# Altium integrated library CoLib.IntLib: 649 symbols (part 4 of 5) (continued)
## LFEC3E-5T144C (continued)
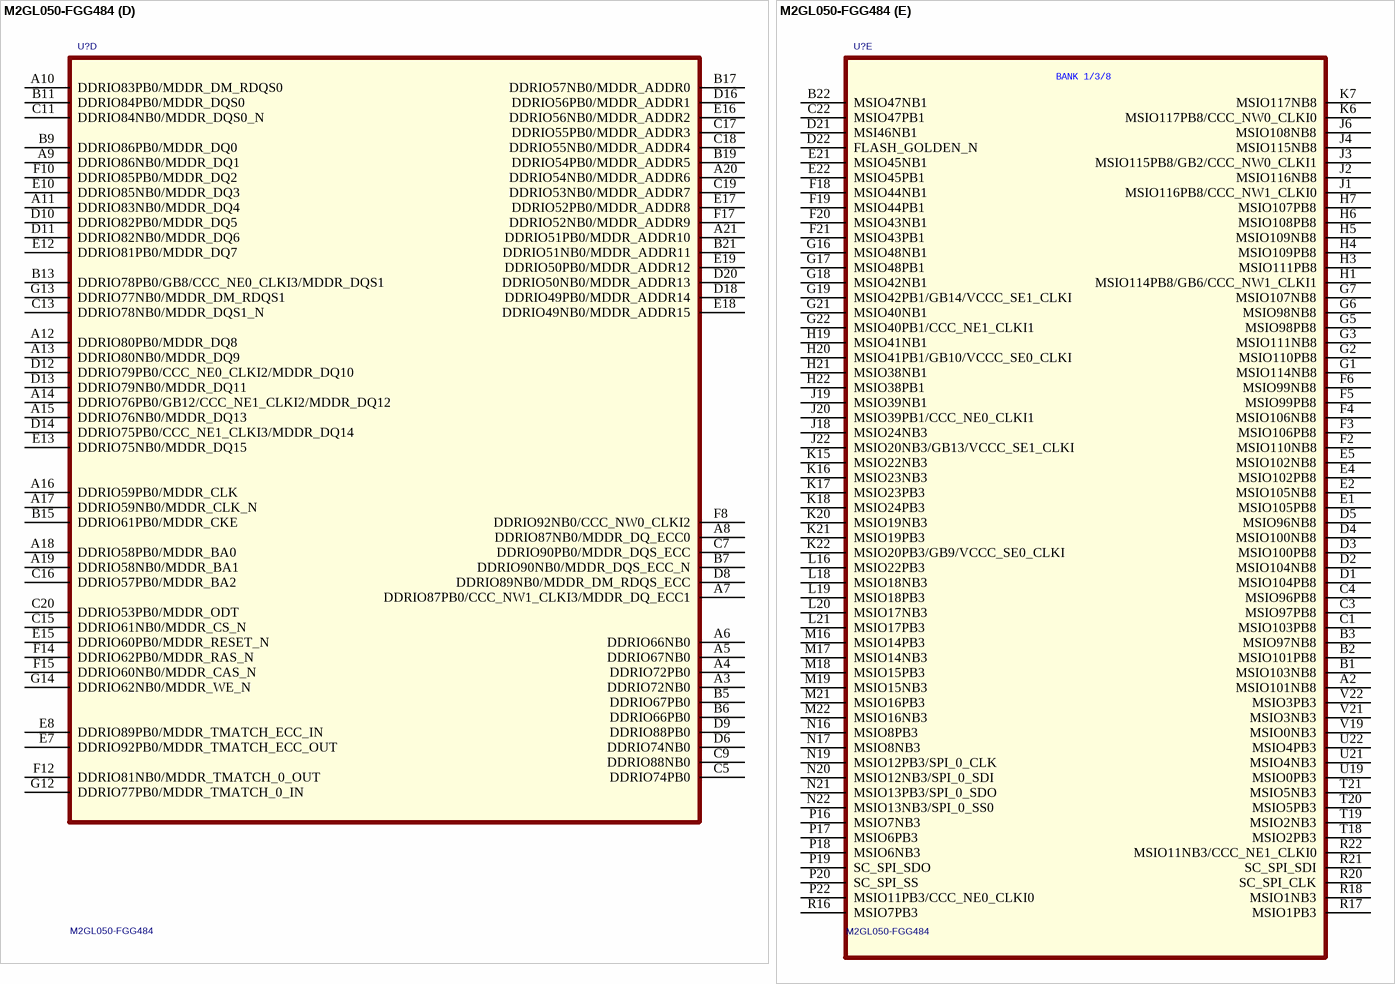
[diagram p32: symbol M2GL050-FGG484]
part A text: BANK 0
part B text: BANK 1
part C text: BANK 2
part D text: BANK 3
part E text: BANK 4
part F text: BANK 5
part G text: BANK 6
part H text: BANK 7

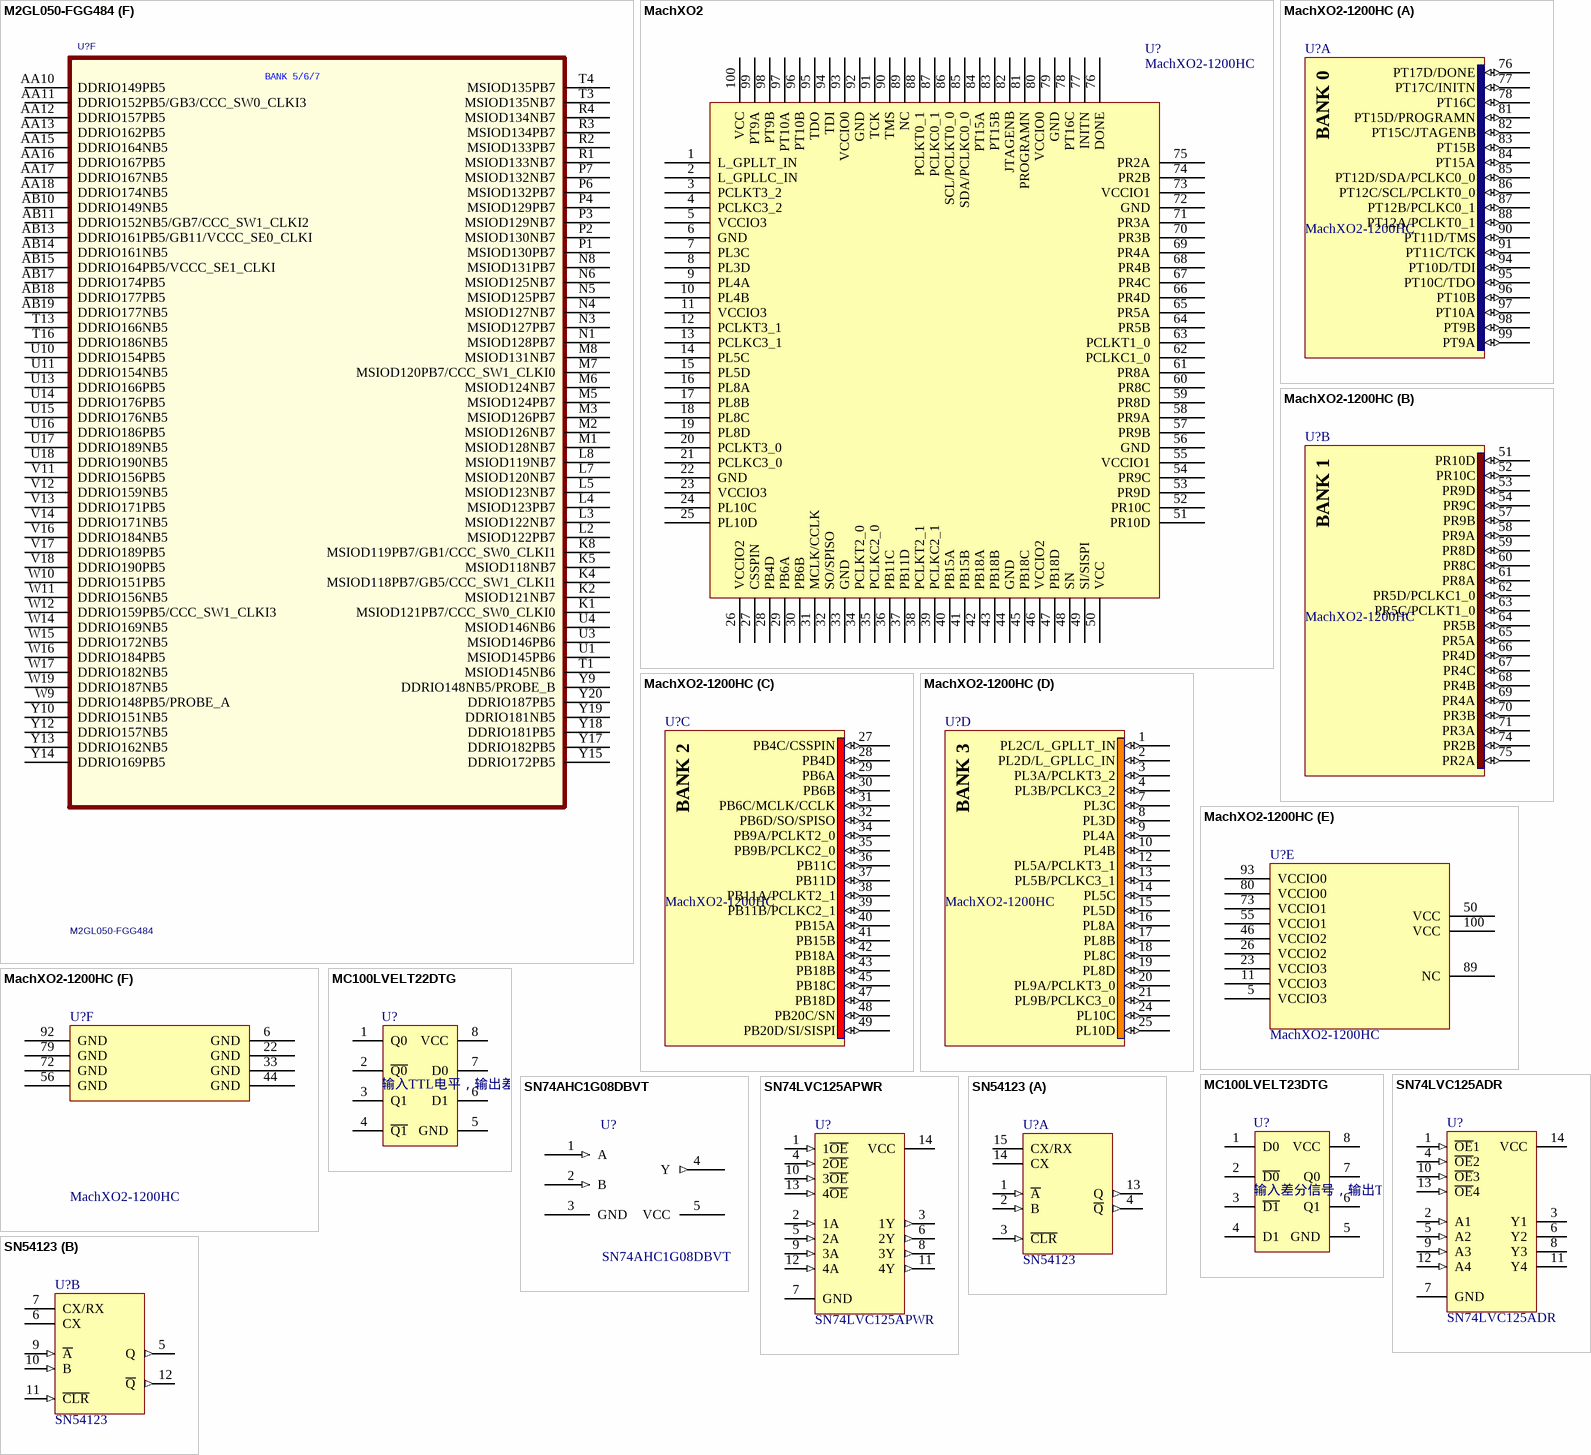
[diagram p33: symbols M2GL050-FGG484 to SN54123]

## M2GL050-FGG484
designator U?
FPGA; Manufacturer: ACTEL; Name: FPGA; Ordering NO.: M2GL050-FGG484
footprint BGA484/1.0_22*22 (BGA, 484-Leads, Body 23.0x23.0mm,  Pitch 1.00mm)
part A pins: AA19 VDDI5_1 (hiz), AB12 VDDI5_2 (hiz), B8 VDDI0_1 (hiz), B12 VDDI0_6 (hiz), B16 VDDI0_7 (hiz), B20 VDDI0_8 (hiz), C2 VDDI8_1 (hiz), C6 VDDI0_9 (hiz), C10 VDDI0_2 (hiz), C14 VDDI0_3 (hiz), D17 VDDI0_10 (hiz), E11 VDDI0_11 (hiz), E20 VDDI1_2 (hiz), F1 VDDI8_2 (hiz), F7 VDDI0_4 (hiz), F9 VDDI0_5 (hiz), F13 VDDI0_12 (hiz), F22 VDDI1_1 (hiz), G4 VDDI8_3 (hiz), G10 VREF0_1 (hiz), G11 VREF0_2 (hiz), G15 VREF0_3 (hiz), H10 VDD1 (hiz), H12 VDDI0_13 (hiz), H14 VDDI0_14 (hiz), H18 VDDI1_3 (hiz), J7 VDDI8_4 (hiz), J9 VDD4 (hiz), J11 VDD2 (hiz), J13 VDD3 (hiz), J21 VDDI1_4 (hiz), K3 VDDI7_1 (hiz), K10 VDD5 (hiz), K12 VDD6 (hiz), K14 VDD7 (hiz), L6 VDDI7_2 (hiz), L9 VDD10 (hiz), L11 VDD8 (hiz), L13 VDD9 (hiz), L15 VPP1 (hiz), L17 VDDI3_1 (hiz), M10 VDD11 (hiz), M12 VDD12 (hiz), M14 VDD13 (hiz), M15 VPPNVM (hiz), M20 VDDI3_2 (hiz), N2 VDDI7_3 (hiz), N9 VDD16 (hiz), N11 VDD14 (hiz), N13 VDD15 (hiz), P5 VDDI7_4 (hiz), P8 VDD20 (hiz), P10 VDD17 (hiz), P12 VDD18 (hiz), P14 VDD19 (hiz), P15 VPP2 (hiz), R8 VDD23 (hiz), R11 VDD21 (hiz), R13 VDD22 (hiz), R19 VDDI3_3 (hiz), T8 VPP3 (hiz), T9 VDD25 (hiz), T10 VDD24 (hiz), T11 VREF5_1 (hiz), T12 VREF5_2 (hiz), T14 VDDI5_3 (hiz), T22 VDDI3_4 (hiz), U2 VDDI6 (hiz), U7 VDD26 (hiz), U8 VDD27 (hiz), U9 VPP4 (hiz), V10 VDDI5_4 (hiz), W13 VDDI5_5 (hiz), W21 VDDI4 (hiz), Y16 VDDI5_6 (hiz)
part B pins: A1 VSS1 (hiz), A22 VSS2 (hiz), AA1 VSS3 (hiz), AA3 VSS5 (hiz), AA5 VSS6 (hiz), AA7 VSS7 (hiz), AA9 VSS8 (hiz), AA14 VSS4 (hiz), AB1 VSS9 (hiz), AB3 VSS12 (hiz), AB5 VSS13 (hiz), AB7 VSS14 (hiz), AB9 VSS15 (hiz), AB16 VSS10 (hiz), AB22 VSS11 (hiz), B4 VSS19 (hiz), B10 VSS16 (hiz), B14 VSS17 (hiz), B18 VSS18 (hiz), C8 VSS22 (hiz), C12 VSS20 (hiz), C21 VSS21 (hiz), D15 VSS23 (hiz), D19 VSS24 (hiz), E3 VSS26 (hiz), E6 VSS27 (hiz), E9 VSS28 (hiz), E14 VSS25 (hiz), F11 VSS29 (hiz), F16 VSS30 (hiz), G20 VSS31 (hiz), H2 VSS34 (hiz), H9 VSS35 (hiz), H11 VSS32 (hiz), H13 VSS33 (hiz), J5 VSS39 (hiz), J10 VSS36 (hiz), J12 VSS37 (hiz), J14 VSS38 (hiz), K9 VSS43 (hiz), K11 VSS40 (hiz), K13 VSS41 (hiz), K19 VSS42 (hiz), L1 VSS44 (hiz), L10 VSS45 (hiz), L12 VSS46 (hiz), L14 VSS47 (hiz), L22 VSS48 (hiz), M4 VSS51 (hiz), M9 VSS52 (hiz), M11 VSS49 (hiz), M13 VSS50 (hiz), N7 VSS57 (hiz), N10 VSS53 (hiz), N12 VSS54 (hiz), N14 VSS55 (hiz), N15 VSSNVM (hiz), N18 VSS56 (hiz), P9 VSS61 (hiz), P11 VSS58 (hiz), P13 VSS59 (hiz), P21 VSS60 (hiz), R5 VSS65 (hiz), R9 VSS66 (hiz), R10 VSS62 (hiz), R12 VSS63 (hiz), R14 VSS64 (hiz), T2 VSS69 (hiz), T6 VSS70 (hiz), T15 VSS67 (hiz), T17 VSS68 (hiz), U6 VSS73 (hiz), U12 VSS71 (hiz), U20 VSS72 (hiz), V1 VSS74 (hiz), V2 VSS76 (hiz), V3 VSS77 (hiz), V4 VSS78 (hiz), V5 VSS79 (hiz), V6 VSS80 (hiz), V7 VSS81 (hiz), V9 VSS82 (hiz), V15 VSS75 (hiz), W1 VSS83 (hiz), W2 VSS85 (hiz), W3 VSS86 (hiz), W4 VSS87 (hiz), W5 VSS88 (hiz), W6 VSS89 (hiz), W7 VSS90 (hiz), W8 VSS91 (hiz), W18 VSS84 (hiz), Y1 VSS92 (hiz), Y2 VSS94 (hiz), Y3 VSS95 (hiz), Y4 VSS96 (hiz), Y5 VSS97 (hiz), Y6 VSS98 (hiz), Y7 VSS99 (hiz), Y8 VSS100 (hiz), Y11 VSS93 (hiz)
part C pins: AA2 DNC1 (hiz), AA4 DNC2 (hiz), AA6 DNC3 (hiz), AA8 DNC4 (hiz), AA20 NC1 (hiz), AA21 XTLOSC_MAIN_EXTAL (hiz), AA22 JTAGSEL (hiz), AB2 DNC5 (hiz), AB4 DNC6 (hiz), AB6 DNC7 (hiz), AB8 DNC8 (hiz), AB20 NC2 (hiz), AB21 XTLOSC_MAIN_XTAL (hiz), D7 MDDR_IMP_CALIB (hiz), G8 CCC_NW1_PLL_VSSA (hiz), G9 CCC_NW1_PLL_VDDA (hiz), H8 CCC_NW0_PLL_VDDA (hiz), H15 CCC_NE0_PLL_VDDA (hiz), H16 HPMS_MDDR_PLL_VDDA (hiz), H17 HPMS_MDDR_PLL_VSSA (hiz), J8 CCC_NW0_PLL_VSSA (hiz), J15 CCC_NE0_PLL_VSSA (hiz), J16 CCC_NE1_PLL_VSSA (hiz), J17 CCC_NE1_PLL_VDDA (hiz), R6 CCC_SW0_PLL_VSSA (hiz), R7 CCC_SW1_PLL_VDDA (hiz), R15 DEVRST_N (hiz), T5 CCC_SW0_PLL_VDDA (hiz), T7 CCC_SW1_PLL_VSSA (hiz), U5 DNC9 (hiz), V8 DNC10 (hiz), V20 JTAG_TMS (hiz), W20 JTAG_TCK (hiz), W22 JTAG_TDI (hiz), Y21 JTAG_TDO (hiz), Y22 JTAG_TRSTB (hiz)
part D pins: A3 DDRIO72NB0 (hiz), A4 DDRIO72PB0 (hiz), A5 DDRIO67NB0 (hiz), A6 DDRIO66NB0 (hiz), A7 DDRIO87PB0/CCC_NW1_CLKI3/MDDR_DQ_ECC1 (hiz), A8 DDRIO87NB0/MDDR_DQ_ECC0 (hiz), A9 DDRIO86NB0/MDDR_DQ1 (hiz), A10 DDRIO83PB0/MDDR_DM_RDQS0 (hiz), A11 DDRIO83NB0/MDDR_DQ4 (hiz), A12 DDRIO80PB0/MDDR_DQ8 (hiz), A13 DDRIO80NB0/MDDR_DQ9 (hiz), A14 DDRIO76PB0/GB12/CCC_NE1_CLKI2/MDDR_DQ12 (hiz), A15 DDRIO76NB0/MDDR_DQ13 (hiz), A16 DDRIO59PB0/MDDR_CLK (hiz), A17 DDRIO59NB0/MDDR_CLK_N (hiz), A18 DDRIO58PB0/MDDR_BA0 (hiz), A19 DDRIO58NB0/MDDR_BA1 (hiz), A20 DDRIO54NB0/MDDR_ADDR6 (hiz), A21 DDRIO51PB0/MDDR_ADDR10 (hiz), B5 DDRIO67PB0 (hiz), B6 DDRIO66PB0 (hiz), B7 DDRIO90NB0/MDDR_DQS_ECC_N (hiz), B9 DDRIO86PB0/MDDR_DQ0 (hiz), B11 DDRIO84PB0/MDDR_DQS0 (hiz), B13 DDRIO78PB0/GB8/CCC_NE0_CLKI3/MDDR_DQS1 (hiz), B15 DDRIO61PB0/MDDR_CKE (hiz), B17 DDRIO57NB0/MDDR_ADDR0 (hiz), B19 DDRIO54PB0/MDDR_ADDR5 (hiz), B21 DDRIO51NB0/MDDR_ADDR11 (hiz), C5 DDRIO74PB0 (hiz), C7 DDRIO90PB0/MDDR_DQS_ECC (hiz), C9 DDRIO88NB0 (hiz), C11 DDRIO84NB0/MDDR_DQS0_N (hiz), C13 DDRIO78NB0/MDDR_DQS1_N (hiz), C15 DDRIO61NB0/MDDR_CS_N (hiz), C16 DDRIO57PB0/MDDR_BA2 (hiz), C17 DDRIO55PB0/MDDR_ADDR3 (hiz), C18 DDRIO55NB0/MDDR_ADDR4 (hiz), C19 DDRIO53NB0/MDDR_ADDR7 (hiz), C20 DDRIO53PB0/MDDR_ODT (hiz), D6 DDRIO74NB0 (hiz), D8 DDRIO89NB0/MDDR_DM_RDQS_ECC (hiz), D9 DDRIO88PB0 (hiz), D10 DDRIO82PB0/MDDR_DQ5 (hiz), D11 DDRIO82NB0/MDDR_DQ6 (hiz), D12 DDRIO79PB0/CCC_NE0_CLKI2/MDDR_DQ10 (hiz), D13 DDRIO79NB0/MDDR_DQ11 (hiz), D14 DDRIO75PB0/CCC_NE1_CLKI3/MDDR_DQ14 (hiz), D16 DDRIO56PB0/MDDR_ADDR1 (hiz), D18 DDRIO49PB0/MDDR_ADDR14 (hiz), D20 DDRIO50NB0/MDDR_ADDR13 (hiz), E7 DDRIO92PB0/MDDR_TMATCH_ECC_OUT (hiz), E8 DDRIO89PB0/MDDR_TMATCH_ECC_IN (hiz), E10 DDRIO85NB0/MDDR_DQ3 (hiz), E12 DDRIO81PB0/MDDR_DQ7 (hiz), E13 DDRIO75NB0/MDDR_DQ15 (hiz), E15 DDRIO60PB0/MDDR_RESET_N (hiz), E16 DDRIO56NB0/MDDR_ADDR2 (hiz), E17 DDRIO52PB0/MDDR_ADDR8 (hiz), E18 DDRIO49NB0/MDDR_ADDR15 (hiz), E19 DDRIO50PB0/MDDR_ADDR12 (hiz), F8 DDRIO92NB0/CCC_NW0_CLKI2 (hiz), F10 DDRIO85PB0/MDDR_DQ2 (hiz), F12 DDRIO81NB0/MDDR_TMATCH_0_OUT (hiz), F14 DDRIO62PB0/MDDR_RAS_N (hiz), F15 DDRIO60NB0/MDDR_CAS_N (hiz), F17 DDRIO52NB0/MDDR_ADDR9 (hiz), G12 DDRIO77PB0/MDDR_TMATCH_0_IN (hiz), G13 DDRIO77NB0/MDDR_DM_RDQS1 (hiz), G14 DDRIO62NB0/MDDR_WE_N (hiz)
part E pins: A2 MSIO101NB8 (hiz), B1 MSIO103NB8 (hiz), B2 MSIO101PB8 (hiz), B3 MSIO97NB8 (hiz), B22 MSIO47NB1 (hiz), C1 MSIO103PB8 (hiz), C3 MSIO97PB8 (hiz), C4 MSIO96PB8 (hiz), C22 MSIO47PB1 (hiz), D1 MSIO104PB8 (hiz), D2 MSIO104NB8 (hiz), D3 MSIO100PB8 (hiz), D4 MSIO100NB8 (hiz), D5 MSIO96NB8 (hiz), D21 MSI46NB1 (hiz), D22 FLASH_GOLDEN_N (hiz), E1 MSIO105PB8 (hiz), E2 MSIO105NB8 (hiz), E4 MSIO102PB8 (hiz), E5 MSIO102NB8 (hiz), E21 MSIO45NB1 (hiz), E22 MSIO45PB1 (hiz), F2 MSIO110NB8 (hiz), F3 MSIO106PB8 (hiz), F4 MSIO106NB8 (hiz), F5 MSIO99PB8 (hiz), F6 MSIO99NB8 (hiz), F18 MSIO44NB1 (hiz), F19 MSIO44PB1 (hiz), F20 MSIO43NB1 (hiz), F21 MSIO43PB1 (hiz), G1 MSIO114NB8 (hiz), G2 MSIO110PB8 (hiz), G3 MSIO111NB8 (hiz), G5 MSIO98PB8 (hiz), G6 MSIO98NB8 (hiz), G7 MSIO107NB8 (hiz), G16 MSIO48NB1 (hiz), G17 MSIO48PB1 (hiz), G18 MSIO42NB1 (hiz), G19 MSIO42PB1/GB14/VCCC_SE1_CLKI (hiz), G21 MSIO40NB1 (hiz), G22 MSIO40PB1/CCC_NE1_CLKI1 (hiz), H1 MSIO114PB8/GB6/CCC_NW1_CLKI1 (hiz), H3 MSIO111PB8 (hiz), H4 MSIO109PB8 (hiz), H5 MSIO109NB8 (hiz), H6 MSIO108PB8 (hiz), H7 MSIO107PB8 (hiz), H19 MSIO41NB1 (hiz), H20 MSIO41PB1/GB10/VCCC_SE0_CLKI (hiz), H21 MSIO38NB1 (hiz), H22 MSIO38PB1 (hiz), J1 MSIO116PB8/CCC_NW1_CLKI0 (hiz), J2 MSIO116NB8 (hiz), J3 MSIO115PB8/GB2/CCC_NW0_CLKI1 (hiz), J4 MSIO115NB8 (hiz), J6 MSIO108NB8 (hiz), J18 MSIO24NB3 (hiz), J19 MSIO39NB1 (hiz), J20 MSIO39PB1/CCC_NE0_CLKI1 (hiz), J22 MSIO20NB3/GB13/VCCC_SE1_CLKI (hiz), K6 MSIO117PB8/CCC_NW0_CLKI0 (hiz), K7 MSIO117NB8 (hiz), K15 MSIO22NB3 (hiz), K16 MSIO23NB3 (hiz), K17 MSIO23PB3 (hiz), K18 MSIO24PB3 (hiz), K20 MSIO19NB3 (hiz), K21 MSIO19PB3 (hiz), K22 MSIO20PB3/GB9/VCCC_SE0_CLKI (hiz), L16 MSIO22PB3 (hiz), L18 MSIO18NB3 (hiz), L19 MSIO18PB3 (hiz), L20 MSIO17NB3 (hiz), L21 MSIO17PB3 (hiz), M16 MSIO14PB3 (hiz), M17 MSIO14NB3 (hiz), M18 MSIO15PB3 (hiz), M19 MSIO15NB3 (hiz), M21 MSIO16PB3 (hiz), M22 MSIO16NB3 (hiz), N16 MSIO8PB3 (hiz), N17 MSIO8NB3 (hiz), N19 MSIO12PB3/SPI_0_CLK (hiz), N20 MSIO12NB3/SPI_0_SDI (hiz), N21 MSIO13PB3/SPI_0_SDO (hiz), N22 MSIO13NB3/SPI_0_SS0 (hiz), P16 MSIO7NB3 (hiz), P17 MSIO6PB3 (hiz), P18 MSIO6NB3 (hiz), P19 SC_SPI_SDO (hiz), P20 SC_SPI_SS (hiz), P22 MSIO11PB3/CCC_NE0_CLKI0 (hiz), R16 MSIO7PB3 (hiz), R17 MSIO1PB3 (hiz), R18 MSIO1NB3 (hiz), R20 SC_SPI_CLK (hiz), R21 SC_SPI_SDI (hiz), R22 MSIO11NB3/CCC_NE1_CLKI0 (hiz), T18 MSIO2PB3 (hiz), T19 MSIO2NB3 (hiz), T20 MSIO5PB3 (hiz), T21 MSIO5NB3 (hiz), U19 MSIO0PB3 (hiz), U21 MSIO4NB3 (hiz), U22 MSIO4PB3 (hiz), V19 MSIO0NB3 (hiz), V21 MSIO3NB3 (hiz), V22 MSIO3PB3 (hiz)
part F pins: AA10 DDRIO149PB5 (hiz), AA11 DDRIO152PB5/GB3/CCC_SW0_CLKI3 (hiz), AA12 DDRIO157PB5 (hiz), AA13 DDRIO162PB5 (hiz), AA15 DDRIO164NB5 (hiz), AA16 DDRIO167PB5 (hiz), AA17 DDRIO167NB5 (hiz), AA18 DDRIO174NB5 (hiz), AB10 DDRIO149NB5 (hiz), AB11 DDRIO152NB5/GB7/CCC_SW1_CLKI2 (hiz), AB13 DDRIO161PB5/GB11/VCCC_SE0_CLKI (hiz), AB14 DDRIO161NB5 (hiz), AB15 DDRIO164PB5/VCCC_SE1_CLKI (hiz), AB17 DDRIO174PB5 (hiz), AB18 DDRIO177PB5 (hiz), AB19 DDRIO177NB5 (hiz), K1 MSIOD121PB7/CCC_SW0_CLKI0 (hiz), K2 MSIOD121NB7 (hiz), K4 MSIOD118PB7/GB5/CCC_SW1_CLKI1 (hiz), K5 MSIOD118NB7 (hiz), K8 MSIOD119PB7/GB1/CCC_SW0_CLKI1 (hiz), L2 MSIOD122PB7 (hiz), L3 MSIOD122NB7 (hiz), L4 MSIOD123PB7 (hiz), L5 MSIOD123NB7 (hiz), L7 MSIOD120NB7 (hiz), L8 MSIOD119NB7 (hiz), M1 MSIOD128NB7 (hiz), M2 MSIOD126NB7 (hiz), M3 MSIOD126PB7 (hiz), M5 MSIOD124PB7 (hiz), M6 MSIOD124NB7 (hiz), M7 MSIOD120PB7/CCC_SW1_CLKI0 (hiz), M8 MSIOD131NB7 (hiz), N1 MSIOD128PB7 (hiz), N3 MSIOD127PB7 (hiz), N4 MSIOD127NB7 (hiz), N5 MSIOD125PB7 (hiz), N6 MSIOD125NB7 (hiz), N8 MSIOD131PB7 (hiz), P1 MSIOD130PB7 (hiz), P2 MSIOD130NB7 (hiz), P3 MSIOD129NB7 (hiz), P4 MSIOD129PB7 (hiz), P6 MSIOD132PB7 (hiz), P7 MSIOD132NB7 (hiz), R1 MSIOD133NB7 (hiz), R2 MSIOD133PB7 (hiz), R3 MSIOD134PB7 (hiz), R4 MSIOD134NB7 (hiz), T1 MSIOD145NB6 (hiz), T3 MSIOD135NB7 (hiz), T4 MSIOD135PB7 (hiz), T13 DDRIO166NB5 (hiz), T16 DDRIO186NB5 (hiz), U1 MSIOD145PB6 (hiz), U3 MSIOD146PB6 (hiz), U4 MSIOD146NB6 (hiz), U10 DDRIO154PB5 (hiz), U11 DDRIO154NB5 (hiz), U13 DDRIO166PB5 (hiz), U14 DDRIO176PB5 (hiz), U15 DDRIO176NB5 (hiz), U16 DDRIO186PB5 (hiz), U17 DDRIO189NB5 (hiz), U18 DDRIO190NB5 (hiz), V11 DDRIO156PB5 (hiz), V12 DDRIO159NB5 (hiz), V13 DDRIO171PB5 (hiz), V14 DDRIO171NB5 (hiz), V16 DDRIO184NB5 (hiz), V17 DDRIO189PB5 (hiz), V18 DDRIO190PB5 (hiz), W9 DDRIO148PB5/PROBE_A (hiz), W10 DDRIO151PB5 (hiz), W11 DDRIO156NB5 (hiz), W12 DDRIO159PB5/CCC_SW1_CLKI3 (hiz), W14 DDRIO169NB5 (hiz), W15 DDRIO172NB5 (hiz), W16 DDRIO184PB5 (hiz), W17 DDRIO182NB5 (hiz), W19 DDRIO187NB5 (hiz), Y9 DDRIO148NB5/PROBE_B (hiz), Y10 DDRIO151NB5 (hiz), Y12 DDRIO157NB5 (hiz), Y13 DDRIO162NB5 (hiz), Y14 DDRIO169PB5 (hiz), Y15 DDRIO172PB5 (hiz), Y17 DDRIO182PB5 (hiz), Y18 DDRIO181PB5 (hiz), Y19 DDRIO181NB5 (hiz), Y20 DDRIO187PB5 (hiz)
part E text: BANK 1/3/8
part F text: BANK 5/6/7

## MachXO2
designator U?, comment MachXO2-1200HC
FPGA, 1280 LUTs, 100Pin; Manufacturer: Lattice; Name: FPGA; Ordering NO.: MachXO2-1200HC
footprint TQFP-100 (Thin QFP, 100-Leads, Body 14x14mm, Pitch 0.5mm, IPC Medium Density)
pins: 1 L_GPLLT_IN, 2 L_GPLLC_IN, 3 PCLKT3_2, 4 PCLKC3_2, 5 VCCIO3, 6 GND, 7 PL3C, 8 PL3D, 9 PL4A, 10 PL4B, 11 VCCIO3, 12 PCLKT3_1, 13 PCLKC3_1, 14 PL5C, 15 PL5D, 16 PL8A, 17 PL8B, 18 PL8C, 19 PL8D, 20 PCLKT3_0, 21 PCLKC3_0, 22 GND, 23 VCCIO3, 24 PL10C, 25 PL10D, 26 VCCIO2, 27 CSSPIN, 28 PB4D, 29 PB6A, 30 PB6B, 31 MCLK/CCLK, 32 SO/SPISO, 33 GND, 34 PCLKT2_0, 35 PCLKC2_0, 36 PB11C, 37 PB11D, 38 PCLKT2_1, 39 PCLKC2_1, 40 PB15A, 41 PB15B, 42 PB18A, 43 PB18B, 44 GND, 45 PB18C, 46 VCCIO2, 47 PB18D, 48 SN, 49 SI/SISPI, 50 VCC, 51 PR10D, 52 PR10C, 53 PR9D, 54 PR9C, 55 VCCIO1, 56 GND, 57 PR9B, 58 PR9A, 59 PR8D, 60 PR8C, 61 PR8A, 62 PCLKC1_0, 63 PCLKT1_0, 64 PR5B, 65 PR5A, 66 PR4D, 67 PR4C, 68 PR4B, 69 PR4A, 70 PR3B, 71 PR3A, 72 GND, 73 VCCIO1, 74 PR2B, 75 PR2A, 76 DONE, 77 INITN, 78 PT16C, 79 GND, 80 VCCIO0, 81 PROGRAMN, 82 JTAGENB, 83 PT15B, 84 PT15A, 85 SDA/PCLKC0_0, 86 SCL/PCLKT0_0, 87 PCLKC0_1, 88 PCLKT0_1, 89 NC, 90 TMS, 91 TCK, 92 GND, 93 VCCIO0, 94 TDI, 95 TDO, 96 PT10B, 97 PT10A, 98 PT9B, 99 PT9A, 100 VCC

## MachXO2-1200HC
designator U?
MachXO 1200 Crossover PLD, 1.8V/2.5V/3.3V, 73 User I/Os, 100-Pins TQFP, Speed Grade-4, Commercial Grade; Manufacturer: Lattice; Name: CPLD; Ordering NO.: MachXO2-1200HC
footprint TQFP100/0.5_14*14 (Thin QFP, 100-Leads, Body 14x14mm, Pitch 0.5mm, IPC Medium Density)
part A pins: 76 PT17D/DONE (io), 77 PT17C/INITN (io), 78 PT16C (io), 81 PT15D/PROGRAMN (io), 82 PT15C/JTAGENB (io), 83 PT15B (io), 84 PT15A (io), 85 PT12D/SDA/PCLKC0_0 (io), 86 PT12C/SCL/PCLKT0_0 (io), 87 PT12B/PCLKC0_1 (io), 88 PT12A/PCLKT0_1 (io), 90 PT11D/TMS (io), 91 PT11C/TCK (io), 94 PT10D/TDI (io), 95 PT10C/TDO (io), 96 PT10B (io), 97 PT10A (io), 98 PT9B (io), 99 PT9A (io)
part B pins: 51 PR10D (io), 52 PR10C (io), 53 PR9D (io), 54 PR9C (io), 57 PR9B (io), 58 PR9A (io), 59 PR8D (io), 60 PR8C (io), 61 PR8A (io), 62 PR5D/PCLKC1_0 (io), 63 PR5C/PCLKT1_0 (io), 64 PR5B (io), 65 PR5A (io), 66 PR4D (io), 67 PR4C (io), 68 PR4B (io), 69 PR4A (io), 70 PR3B (io), 71 PR3A (io), 74 PR2B (io), 75 PR2A (io)
part C pins: 27 PB4C/CSSPIN (io), 28 PB4D (io), 29 PB6A (io), 30 PB6B (io), 31 PB6C/MCLK/CCLK (io), 32 PB6D/SO/SPISO (io), 34 PB9A/PCLKT2_0 (io), 35 PB9B/PCLKC2_0 (io), 36 PB11C (io), 37 PB11D (io), 38 PB11A/PCLKT2_1 (io), 39 PB11B/PCLKC2_1 (io), 40 PB15A (io), 41 PB15B (io), 42 PB18A (io), 43 PB18B (io), 45 PB18C (io), 47 PB18D (io), 48 PB20C/SN (io), 49 PB20D/SI/SISPI (io)
part D pins: 1 PL2C/L_GPLLT_IN (io), 2 PL2D/L_GPLLC_IN (io), 3 PL3A/PCLKT3_2 (io), 4 PL3B/PCLKC3_2 (io), 7 PL3C (io), 8 PL3D (io), 9 PL4A (io), 10 PL4B (io), 12 PL5A/PCLKT3_1 (io), 13 PL5B/PCLKC3_1 (io), 14 PL5C (io), 15 PL5D (io), 16 PL8A (io), 17 PL8B (io), 18 PL8C (io), 19 PL8D (io), 20 PL9A/PCLKT3_0 (io), 21 PL9B/PCLKC3_0 (io), 24 PL10C (io), 25 PL10D (io)
part E pins: 5 VCCIO3 (power), 11 VCCIO3 (power), 23 VCCIO3 (power), 26 VCCIO2 (power), 46 VCCIO2 (power), 50 VCC (power), 55 VCCIO1 (power), 73 VCCIO1 (power), 80 VCCIO0 (power), 89 NC, 93 VCCIO0 (power), 100 VCC (power)
part F pins: 6 GND (power), 22 GND (power), 33 GND (power), 44 GND (power), 56 GND (power), 72 GND (power), 79 GND (power), 92 GND (power)
part A text: BANK 0
part B text: BANK 1
part C text: BANK 2
part D text: BANK 3

## MC100LVELT22DTG
designator U?, comment 输入TTL电平，输出差分信号
Manufacturer: ON semiconductor; Name: 电平转换芯片; Ordering NO.: MC100LVELT22DTG
footprint TSSOP8/0.65_3*3 (Footprint not found)
pins: 1 Q0, 2 ~{Q0}, 3 Q1, 4 ~{Q1}, 5 GND, 6 D1, 7 D0, 8 VCC

## MC100LVELT23DTG
designator U?, comment 输入差分信号，输出TTL电平
Manufacturer: ON semiconductor; Name: 电平转换芯片; Ordering NO.: MC100LVELT23DTG
footprint TSSOP8/0.65_3*3 (Footprint not found)
pins: 1 D0, 2 ~{D0}, 3 ~{D1}, 4 D1, 5 GND, 6 Q1, 7 Q0, 8 VCC

## SN74AHC1G08DBVT
designator U?
Single 2-Input POSITIVE-AND Gate; Manufacturer: TI; Name: 逻辑门; Ordering NO.: SN74AHC1G08DBVT
footprint SOT23-5 (SOT-23/SC-74A; 5 Leads; Body 3 x 3 mm, inc. leads (LxW max))
pins: 1 A (in), 2 B (in), 3 GND (power), 4 Y (out), 5 VCC (power)

## SN74LVC125ADR
designator U?
Quadruple Bus Buffer Gate with 3-State Outputs; Manufacturer: TI; Name: 逻辑门; Ordering NO.: SN74LVC125ADR
footprint SO14/1.27_8.65*3.9 (SOIC, 14-Leads, Body 8.65x3.9mm, Pitch 1.27mm, IPC Medium Density)
3D model D014 (14-Pin Small Outline Integrated Circuit 1.27 mm Pitch)
signal-integrity model SN74LVC125AD
pins: 1 ~{OE}1 (in), 2 A1 (in), 3 Y1 (hiz), 4 ~{OE}2 (in), 5 A2 (in), 6 Y2 (hiz), 7 GND (power), 8 Y3 (hiz), 9 A3 (in), 10 ~{OE}3 (in), 11 Y4 (hiz), 12 A4 (in), 13 ~{OE}4 (in), 14 VCC (power)

## SN74LVC125APWR
designator U?
Quadruple Bus Buffer Gate with 3-State Outputs; Manufacturer: TI; Name: 逻辑门; Ordering NO.: SN74LVC125APWR
footprint TSSOP14/0.65_5.0*4.4 (TSSOP, 14-Leads, Body 5.1x4.5mm (max), Pitch 0.65mm, IPC Medium Density)
pins: 1 1~{OE} (in), 2 1A (in), 3 1Y (out), 4 2~{OE} (in), 5 2A (in), 6 2Y (out), 7 GND (power), 8 3Y (out), 9 3A (in), 10 3~{OE} (in), 11 4Y (out), 12 4A (in), 13 4~{OE} (in), 14 VCC (power)

## SN54123
designator U?
Retriggerable Monostable Multivibrator; Manufacturer: TI; Name: 逻辑门; Ordering NO.: SN54123
footprint SO16/1.27_10.9*7.2 (DFP; 16 Leads; Body 10.9 x 7.2 mm (LxW max); Pitch 1.27 mm)
3D model W016 (DFP; 16 Leads; Body 10.9 x 7.2 mm (LxW max); Pitch 1.27 mm)
signal-integrity model SN54123
pins on every part: 8 GND (power) hidden to GND, 16 VCC (power) hidden to VCC
part A pins: 1 ~{A} (in), 2 B (in), 3 ~{CLR} (in), 4 ~{Q} (out), 13 Q (out), 14 CX, 15 CX/RX
part B pins: 5 Q (out), 6 CX, 7 CX/RX, 9 ~{A} (in), 10 B (in), 11 ~{CLR} (in), 12 ~{Q} (out)


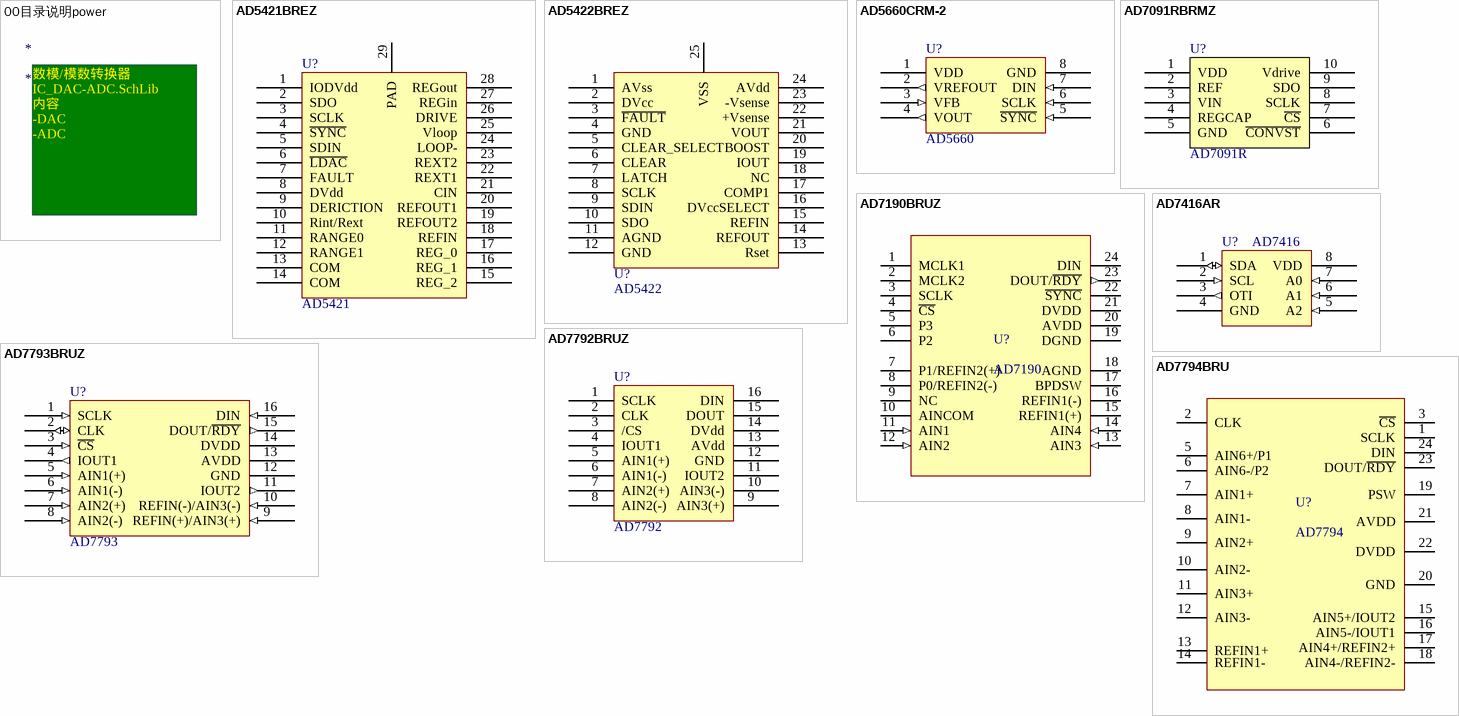
[diagram p34: symbols 00目录说明power to AD7794BRU]

## 00目录说明power
designator *
text: 数模/模数转换器IC_DAC-ADC.SchLib / 内容 / -DAC / -ADC /

## AD5421BREZ
designator U?, comment AD5421
16-Bit, Serial Input, Loop-Powered 4 mA to 20 mA DAC; Manufacturer: ADI; Name: 数模转换器; Ordering NO.: AD5421BREZ
footprint TSSOP28/0.65_9.7*4.4-T
pins: 1 IODVdd, 2 SDO, 3 SCLK, 4 ~{SYNC}, 5 SDIN, 6 ~{LDAC}, 7 FAULT, 8 DVdd, 9 DERICTION, 10 Rint/Rext, 11 RANGE0, 12 RANGE1, 13 COM, 14 COM, 15 REG_2, 16 REG_1, 17 REG_0, 18 REFIN, 19 REFOUT2, 20 REFOUT1, 21 CIN, 22 REXT1, 23 REXT2, 24 LOOP-, 25 Vloop, 26 DRIVE, 27 REGin, 28 REGout, 29 PAD

## AD5422BREZ
designator U?, comment AD5422
Single Channel, 16-Bit, Serial Input, Current  Source and Voltage Output DACs, HART Connectivity; Manufacturer: ADI; Name: 数模转换器; Ordering NO.: AD5422BREZ
footprint TSSOP24/0.65_7.8*4.4-T
pins: 1 AVss, 2 DVcc, 3 ~{FAULT}, 4 GND, 5 CLEAR_SELECT, 6 CLEAR, 7 LATCH, 8 SCLK, 9 SDIN, 10 SDO, 11 AGND, 12 GND, 13 Rset, 14 REFOUT, 15 REFIN, 16 DVccSELECT, 17 COMP1, 18 NC, 19 IOUT, 20 BOOST, 21 VOUT, 22 +Vsense, 23 -Vsense, 24 AVdd, 25 VSS

## AD5660CRM-2
designator U?, comment AD5660
±16 LSB INL, 10 ppm/°C Ref, 5 V; Manufacturer: ADI; Ordering NO.: AD5660CRM-2; Name: 数模转换器
footprint MSOP8/0.65_3*3 (MSOP,8 PIN,Pitch 0.65mm,Body 3mmX3mm)
pins: 1 VDD (power), 2 VREFOUT (out), 3 VFB (in), 4 VOUT (out), 5 ~{SYNC} (in), 6 SCLK (in), 7 DIN (in), 8 GND (power)

## AD7091RBRMZ
designator U?, comment AD7091R
单通道, 1 MSPS、超低功耗、12-Bit ADC，  采用10引脚LFCSP和MSOP封装; Manufacturer: ADI; Name: 模数转换器; Ordering NO.: AD7091RBRMZ
footprint MSOP10/0.5_3*3 (MSOP,8 PIN,Pitch 0.65mm,Body 4mmX3mm)
pins: 1 VDD, 2 REF, 3 VIN, 4 REGCAP, 5 GND, 6 ~{CONVST}, 7 ~{CS}, 8 SCLK, 9 SDO, 10 Vdrive

## AD7190BRUZ
designator U?, comment AD7190
4.8 kHz Ultralow Noise 24-Bit  Sigma-Delta ADC with PGA; Manufacturer: ADI; Ordering NO.: AD7190BRUZ; Name: 模数转换器
footprint TSSOP24/0.65_7.8*4.4 (TSOP, 24-Leads, Body 7.9x4.5mm (max), Pitch 0.65mm, IPC Medium Density)
pins: 1 MCLK1, 2 MCLK2, 3 SCLK, 4 ~{CS}, 5 P3, 6 P2, 7 P1/REFIN2(+), 8 P0/REFIN2(-), 9 NC, 10 AINCOM, 11 AIN1 (in), 12 AIN2 (in), 13 AIN3 (in), 14 AIN4 (in), 15 REFIN1(+), 16 REFIN1(-), 17 BPDSW, 18 AGND (power), 19 DGND, 20 AVDD, 21 DVDD (power), 22 ~{SYNC}, 23 DOUT/~{RDY} (out), 24 DIN

## AD7416AR
designator U?, comment AD7416
10-Bit Digital Temperature Sensor (AD7416); Manufacturer: ADI; Ordering NO.: AD7416AR; Name: 模数转换器
footprint SO8/1.27_4.9*3.9 (SOIC, 8-Leads, Body 4.9x3.9mm, Pitch 1.27mm,)
pins: 1 SDA (io), 2 SCL (in), 3 OTI (out), 4 GND (power), 5 A2 (in), 6 A1 (in), 7 A0 (in), 8 VDD (power)

## AD7792BRUZ
designator U?, comment AD7792
Low Power, 16 Bit Sigma-Delta ADC with   Low-Noise In-Amp and Embedded Reference; Manufacturer: ADI; Ordering NO.: AD7792BRUZ; Name: 模数转换器
footprint TSSOP16/0.65_5.0*4.4 (TSSOP, 16-Leads, Body 5.0x4.4mm , Pitch 0.65mm, IPC Medium Density)
pins: 1 SCLK, 2 CLK, 3 /CS, 4 IOUT1, 5 AIN1(+), 6 AIN1(-), 7 AIN2(+), 8 AIN2(-), 9 AIN3(+), 10 AIN3(-), 11 IOUT2, 12 GND, 13 AVdd, 14 DVdd, 15 DOUT, 16 DIN

## AD7793BRUZ
designator U?, comment AD7793
Low Power, 24 Bit Sigma-Delta ADC with   Low-Noise In-Amp and Embedded Reference; Manufacturer: ADI; Name: 模数转换器; Ordering NO.: AD7793BRUZ
footprint TSSOP16/0.65_5.0*4.4 (TSSOP, 16-Leads, Body 5.0x4.4mm , Pitch 0.65mm, IPC Medium Density)
pins: 1 SCLK (in), 2 CLK (io), 3 ~{CS} (in), 4 IOUT1 (out), 5 AIN1(+) (in), 6 AIN1(-) (in), 7 AIN2(+) (in), 8 AIN2(-) (in), 9 REFIN(+)/AIN3(+) (in), 10 REFIN(-)/AIN3(-) (in), 11 IOUT2 (out), 12 GND (power), 13 AVDD (power), 14 DVDD (power), 15 DOUT/~{RDY} (out), 16 DIN (in)